# Altium footprint library ICs And Semiconductors SMD.PcbLib: 943 footprints (part 17 of 60)
Each footprint in its own frame and in the unit in brackets; x right, y up, seen from the top. Pads: shape width x height; smd on the part's side, far side on the other; paste and mask are expansions set on the pad; w line width, h text height; cw(c..) or ccw(c..) is an arc to the next point about the centre after c.
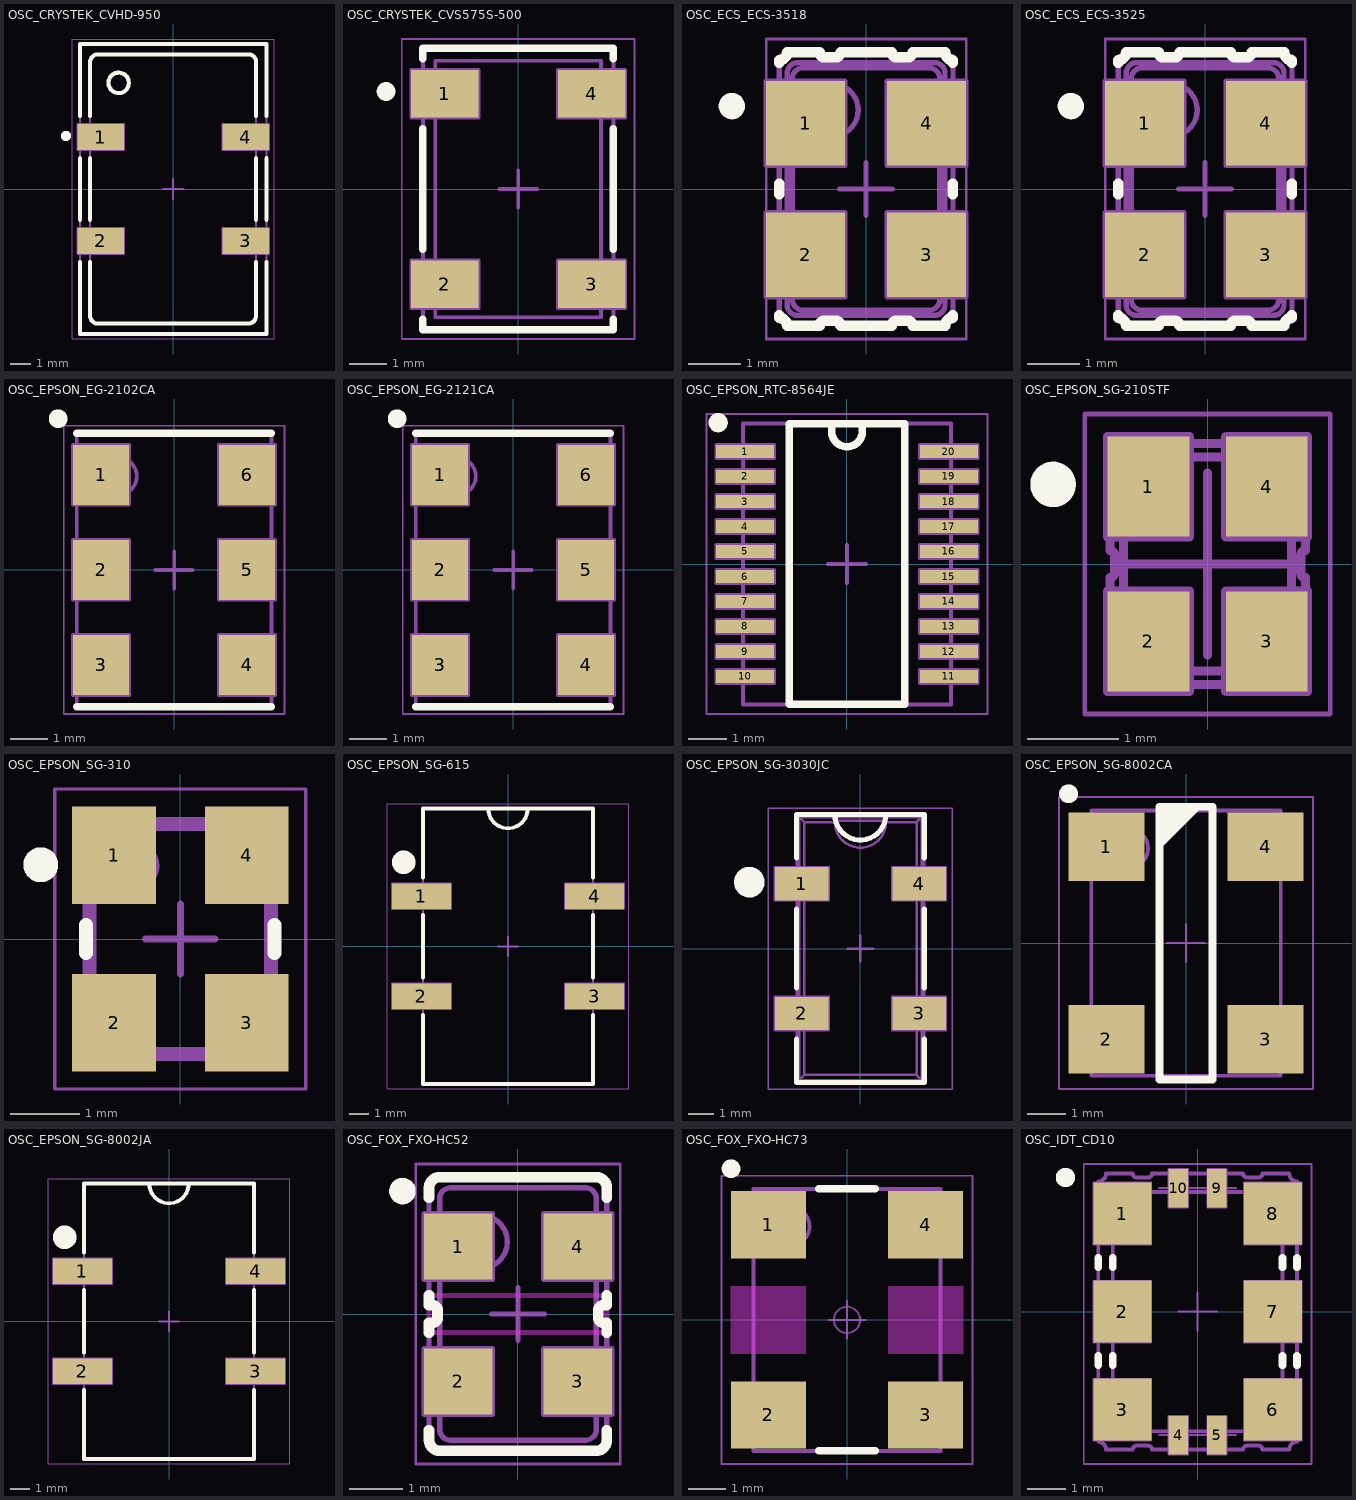
[diagram p16: the footprints below, top view; thin cyan lines are the x and y axes]

## OSC_CRYSTEK_CVHD-950 [mm] "Oscillator, 5.08mm Pitch; 4 Pin, 14.2mm L X 9.14mm W X 5.3mm H, CVHD-950 Serie"
height 5.3
pads (4):
  rect 2.28x1.27 smd: 1(-3.555,2.54) 2(-3.555,-2.54) 3(3.555,-2.54) 4(3.555,2.54)
Top Overlay:
  circle w0.2: c-2.67,5.2 r0.5
  circle w0.25: c-5.25,2.6 r0.125
  lines w0.2: -4.57,-3.575 -4.57,-7.1 4.57,-7.1 4.57,-3.575 ; -4.57,-1.505 -4.57,1.505 ; -4.57,3.575 -4.57,7.1 4.57,7.1 4.57,3.575 ; -4.07,-3.575 -4.07,-6.2 ccw(c-3.67,-6.2) -3.67,-6.6 3.67,-6.6 ccw(c3.67,-6.2) 4.07,-6.2 4.07,-3.575 ; -4.07,-1.505 -4.07,1.505 ; -4.07,3.575 -4.07,6.2 cw(c-3.67,6.2) -3.67,6.6 3.67,6.6 cw(c3.67,6.2) 4.07,6.2 4.07,3.575 ; 4.07,-1.505 4.07,1.505 ; 4.57,-1.505 4.57,1.505
Mechanical 8:
  lines w0.1: -4.055,-2.54 -3.555,-2.54 ; -4.055,2.54 -3.555,2.54 ; -3.555,-3.04 -3.555,-2.54 ; -3.555,-2.04 -3.555,-2.54 ; -3.555,2.04 -3.555,2.54 ; -3.555,3.04 -3.555,2.54 ; -3.055,-2.54 -3.555,-2.54 ; -3.055,2.54 -3.555,2.54 ; -0.5,0 0,0 ; 0,-0.5 0,0 ; 0,0.5 0,0 ; 0.5,0 0,0 ; 3.055,-2.54 3.555,-2.54 ; 3.055,2.54 3.555,2.54 ; 3.555,-3.04 3.555,-2.54 ; 3.555,-2.04 3.555,-2.54 ; 3.555,2.04 3.555,2.54 ; 3.555,3.04 3.555,2.54 ; 4.055,-2.54 3.555,-2.54 ; 4.055,2.54 3.555,2.54 ; -4.695,-3.175 -4.695,-1.905 -2.415,-1.905 -2.415,-3.175 -4.695,-3.175 ; -4.695,1.905 -4.695,3.175 -2.415,3.175 -2.415,1.905 -4.695,1.905 ; 2.415,-3.175 2.415,-1.905 4.695,-1.905 4.695,-3.175 2.415,-3.175 ; 2.415,1.905 2.415,3.175 4.695,3.175 4.695,1.905 2.415,1.905
Mechanical 14:
  circle w0.1: c-2.67,5.2 r0.5
  lines w0.1: -4.57,-3.045 -4.07,-3.045 ; -4.57,-2.035 -4.07,-2.035 ; -4.57,2.035 -4.07,2.035 ; -4.57,3.045 -4.07,3.045 ; 4.07,-3.045 4.57,-3.045 ; 4.07,-2.035 4.57,-2.035 ; 4.07,2.035 4.57,2.035 ; 4.07,3.045 4.57,3.045 ; -4.57,-7.1 4.57,-7.1 4.57,-2.94 cw(c4.57,-2.54) 4.57,-2.14 4.57,2.14 cw(c4.57,2.54) 4.57,2.94 4.57,7.1 -4.57,7.1 -4.57,2.94 cw(c-4.57,2.54) -4.57,2.14 -4.57,-2.14 cw(c-4.57,-2.54) -4.57,-2.94 -4.57,-7.1 ; -4.07,-6.2 ccw(c-3.67,-6.2) -3.67,-6.6 3.67,-6.6 ccw(c3.67,-6.2) 4.07,-6.2 4.07,6.2 ccw(c3.67,6.2) 3.67,6.6 -3.67,6.6 ccw(c-3.67,6.2) -4.07,6.2 -4.07,-6.2
Mechanical 15:
  lines w0.05: -4.945,-7.35 -4.945,7.35 4.945,7.35 4.945,-7.35 -4.945,-7.35
3D body "OSC_CRYSTEK_CVHD-950.stp": height 5.3, standoff 0, extent -4.57,-7.1 4.57,7.1

## OSC_CRYSTEK_CVS575S-500 [mm] "VCO, 5.08mm Pitch; 4 Pin, 5.08mm L X 7.5mm W X 2.5mm H"
height 2.5
pads (4):
  rect 1.8x1.27 smd: 1(-1.955,2.54) 2(-1.955,-2.54) 3(1.955,-2.54) 4(1.955,2.54)
Top Overlay:
  circle w0.25: c-3.525,2.6 r0.125
  lines w0.2: -2.54,-3.475 -2.54,-3.75 2.54,-3.75 2.54,-3.475 ; -2.54,-1.605 -2.54,1.605 ; -2.54,3.475 -2.54,3.75 2.54,3.75 2.54,3.475 ; 2.54,-1.605 2.54,1.605
Mechanical 8:
  lines w0.1: -2.455,-2.54 -1.955,-2.54 ; -2.455,2.54 -1.955,2.54 ; -1.955,-3.04 -1.955,-2.54 ; -1.955,-2.04 -1.955,-2.54 ; -1.955,2.04 -1.955,2.54 ; -1.955,3.04 -1.955,2.54 ; -1.455,-2.54 -1.955,-2.54 ; -1.455,2.54 -1.955,2.54 ; -0.5,0 0,0 ; 0,-0.5 0,0 ; 0,0.5 0,0 ; 0.5,0 0,0 ; 1.455,-2.54 1.955,-2.54 ; 1.455,2.54 1.955,2.54 ; 1.955,-3.04 1.955,-2.54 ; 1.955,-2.04 1.955,-2.54 ; 1.955,2.04 1.955,2.54 ; 1.955,3.04 1.955,2.54 ; 2.455,-2.54 1.955,-2.54 ; 2.455,2.54 1.955,2.54 ; -2.855,-3.175 -1.055,-3.175 -1.055,-1.905 -2.855,-1.905 -2.855,-3.175 ; -2.855,1.905 -1.055,1.905 -1.055,3.175 -2.855,3.175 -2.855,1.905 ; 1.055,-3.175 2.855,-3.175 2.855,-1.905 1.055,-1.905 1.055,-3.175 ; 1.055,1.905 2.855,1.905 2.855,3.175 1.055,3.175 1.055,1.905
Mechanical 14:
  circle w0.1: c-1.555,2.55 r0.4
  lines w0.1: -2.54,-3.75 -2.54,3.75 2.54,3.75 2.54,-3.75 -2.54,-3.75 ; -2.21,-3.42 2.21,-3.42 2.21,3.42 -2.21,3.42 -2.21,-3.42
Mechanical 15:
  lines w0.05: -3.105,-4 -3.105,4 3.105,4 3.105,-4 -3.105,-4
3D body "OSC_CRYSTEK_CVS575S-500.stp": height 2.5, standoff 0, extent -2.54,-3.75 2.54,3.75

## OSC_ECS_ECS-3518 [mm] "SMD Oscillator, 4 pins, 5 x 3.2mm, 3518 Series"
height 1.3
pads (4):
  rect 1.5x1.6 smd: 1(-1.15,1.25) 2(-1.15,-1.25) 3(1.15,-1.25) 4(1.15,1.25)
Top Overlay:
  circle w0.25: c-2.55,1.575 r0.125
  lines w0.2: -1.65,-2.4 -1.65,-2.45 cw(c-1.65,-2.6) -1.5,-2.6 -0.885,-2.6 cw(c-0.785,-2.6) -0.785,-2.5 -0.585,-2.5 cw(c-0.585,-2.6) -0.485,-2.6 0.485,-2.6 cw(c0.585,-2.6) 0.585,-2.5 0.785,-2.5 cw(c0.785,-2.6) 0.885,-2.6 1.5,-2.6 cw(c1.65,-2.6) 1.65,-2.45 1.65,-2.4 ; -1.65,-0.1 -1.65,0.1 ; -1.65,2.4 -1.65,2.45 ccw(c-1.65,2.6) -1.5,2.6 -0.885,2.6 ccw(c-0.785,2.6) -0.785,2.5 -0.585,2.5 ccw(c-0.585,2.6) -0.485,2.6 0.485,2.6 ccw(c0.585,2.6) 0.585,2.5 0.785,2.5 ccw(c0.785,2.6) 0.885,2.6 1.5,2.6 ccw(c1.65,2.6) 1.65,2.45 1.65,2.4 ; 1.65,-0.1 1.65,0.1
Mechanical 8:
  lines w0.1: -1.65,-1.25 -1.15,-1.25 ; -1.65,1.25 -1.15,1.25 ; -1.15,-1.75 -1.15,-1.25 ; -1.15,-0.75 -1.15,-1.25 ; -1.15,0.75 -1.15,1.25 ; -1.15,1.75 -1.15,1.25 ; -0.65,-1.25 -1.15,-1.25 ; -0.65,1.25 -1.15,1.25 ; -0.5,0 0,0 ; 0,-0.5 0,0 ; 0,0.5 0,0 ; 0.5,0 0,0 ; 0.65,-1.25 1.15,-1.25 ; 0.65,1.25 1.15,1.25 ; 1.15,-1.75 1.15,-1.25 ; 1.15,-0.75 1.15,-1.25 ; 1.15,0.75 1.15,1.25 ; 1.15,1.75 1.15,1.25 ; 1.65,-1.25 1.15,-1.25 ; 1.65,1.25 1.15,1.25 ; -1.9,-2.05 -1.9,-0.45 -0.4,-0.45 -0.4,-2.05 -1.9,-2.05 ; -1.9,0.45 -1.9,2.05 -0.4,2.05 -0.4,0.45 -1.9,0.45 ; 0.4,-2.05 0.4,-0.45 1.9,-0.45 1.9,-2.05 0.4,-2.05 ; 0.4,0.45 0.4,2.05 1.9,2.05 1.9,0.45 0.4,0.45
Mechanical 14:
  circle w0.1: c-0.65,1.5 r0.5
  lines w0.1: -1.65,-2.45 cw(c-1.65,-2.6) -1.5,-2.6 -0.885,-2.6 cw(c-0.785,-2.6) -0.785,-2.5 -0.585,-2.5 cw(c-0.585,-2.6) -0.485,-2.6 0.485,-2.6 cw(c0.585,-2.6) 0.585,-2.5 0.785,-2.5 cw(c0.785,-2.6) 0.885,-2.6 1.5,-2.6 cw(c1.65,-2.6) 1.65,-2.45 1.65,-1.97 1.55,-1.87 1.55,-0.67 1.65,-0.57 1.65,0.57 1.55,0.67 1.55,1.87 1.65,1.97 1.65,2.45 cw(c1.65,2.6) 1.5,2.6 0.885,2.6 cw(c0.785,2.6) 0.785,2.5 0.585,2.5 cw(c0.585,2.6) 0.485,2.6 -0.485,2.6 cw(c-0.585,2.6) -0.585,2.5 -0.785,2.5 cw(c-0.785,2.6) -0.885,2.6 -1.5,2.6 cw(c-1.65,2.6) -1.65,2.45 -1.65,1.97 -1.55,1.87 -1.55,0.67 -1.65,0.57 -1.65,-0.57 -1.55,-0.67 -1.55,-1.87 -1.65,-1.97 -1.65,-2.45 ; -1.5,-2.2 ccw(c-1.3,-2.2) -1.3,-2.4 1.3,-2.4 ccw(c1.3,-2.2) 1.5,-2.2 1.5,2.2 ccw(c1.3,2.2) 1.3,2.4 -1.3,2.4 ccw(c-1.3,2.2) -1.5,2.2 -1.5,-2.2 ; -1.4,-2.1 ccw(c-1.197,-2.099) -1.2,-2.302 1.2,-2.3 ccw(c1.2,-2.1) 1.4,-2.1 1.4,2.1 ccw(c1.2,2.1) 1.2,2.3 -1.2,2.3 ccw(c-1.2,2.1) -1.4,2.1 -1.4,-2.1
Mechanical 15:
  lines w0.05: -1.9,-2.85 1.9,-2.85 1.9,2.85 -1.9,2.85 -1.9,-2.85
3D body "OSC_ECS_3518.stp": height 1.3, standoff 0, extent -1.65,-2.6 1.65,2.6

## OSC_ECS_ECS-3525 [mm] "SMD Oscillator, 4 pins, 5 x 3.2mm, 3525 Series"
height 1.3
pads (4):
  rect 1.5x1.6 smd: 1(-1.15,1.25) 2(-1.15,-1.25) 3(1.15,-1.25) 4(1.15,1.25)
Top Overlay:
  circle w0.25: c-2.55,1.575 r0.125
  lines w0.2: -1.65,-2.4 -1.65,-2.45 cw(c-1.65,-2.6) -1.5,-2.6 -0.885,-2.6 cw(c-0.785,-2.6) -0.785,-2.5 -0.585,-2.5 cw(c-0.585,-2.6) -0.485,-2.6 0.485,-2.6 cw(c0.585,-2.6) 0.585,-2.5 0.785,-2.5 cw(c0.785,-2.6) 0.885,-2.6 1.5,-2.6 cw(c1.65,-2.6) 1.65,-2.45 1.65,-2.4 ; -1.65,-0.1 -1.65,0.1 ; -1.65,2.4 -1.65,2.45 ccw(c-1.65,2.6) -1.5,2.6 -0.885,2.6 ccw(c-0.785,2.6) -0.785,2.5 -0.585,2.5 ccw(c-0.585,2.6) -0.485,2.6 0.485,2.6 ccw(c0.585,2.6) 0.585,2.5 0.785,2.5 ccw(c0.785,2.6) 0.885,2.6 1.5,2.6 ccw(c1.65,2.6) 1.65,2.45 1.65,2.4 ; 1.65,-0.1 1.65,0.1
Mechanical 8:
  lines w0.1: -1.65,-1.25 -1.15,-1.25 ; -1.65,1.25 -1.15,1.25 ; -1.15,-1.75 -1.15,-1.25 ; -1.15,-0.75 -1.15,-1.25 ; -1.15,0.75 -1.15,1.25 ; -1.15,1.75 -1.15,1.25 ; -0.65,-1.25 -1.15,-1.25 ; -0.65,1.25 -1.15,1.25 ; -0.5,0 0,0 ; 0,-0.5 0,0 ; 0,0.5 0,0 ; 0.5,0 0,0 ; 0.65,-1.25 1.15,-1.25 ; 0.65,1.25 1.15,1.25 ; 1.15,-1.75 1.15,-1.25 ; 1.15,-0.75 1.15,-1.25 ; 1.15,0.75 1.15,1.25 ; 1.15,1.75 1.15,1.25 ; 1.65,-1.25 1.15,-1.25 ; 1.65,1.25 1.15,1.25 ; -1.9,-2.05 -0.4,-2.05 -0.4,-0.45 -1.9,-0.45 -1.9,-2.05 ; -1.9,0.45 -0.4,0.45 -0.4,2.05 -1.9,2.05 -1.9,0.45 ; 0.4,-2.05 1.9,-2.05 1.9,-0.45 0.4,-0.45 0.4,-2.05 ; 0.4,0.45 1.9,0.45 1.9,2.05 0.4,2.05 0.4,0.45
Mechanical 14:
  circle w0.1: c-0.65,1.5 r0.5
  lines w0.1: -1.65,-2.45 cw(c-1.65,-2.6) -1.5,-2.6 -0.885,-2.6 cw(c-0.785,-2.6) -0.785,-2.5 -0.585,-2.5 cw(c-0.585,-2.6) -0.485,-2.6 0.485,-2.6 cw(c0.585,-2.6) 0.585,-2.5 0.785,-2.5 cw(c0.785,-2.6) 0.885,-2.6 1.5,-2.6 cw(c1.65,-2.6) 1.65,-2.45 1.65,-1.97 1.55,-1.87 1.55,-0.67 1.65,-0.57 1.65,0.57 1.55,0.67 1.55,1.87 1.65,1.97 1.65,2.45 cw(c1.65,2.6) 1.5,2.6 0.885,2.6 cw(c0.785,2.6) 0.785,2.5 0.585,2.5 cw(c0.585,2.6) 0.485,2.6 -0.485,2.6 cw(c-0.585,2.6) -0.585,2.5 -0.785,2.5 cw(c-0.785,2.6) -0.885,2.6 -1.5,2.6 cw(c-1.65,2.6) -1.65,2.45 -1.65,1.97 -1.55,1.87 -1.55,0.67 -1.65,0.57 -1.65,-0.57 -1.55,-0.67 -1.55,-1.87 -1.65,-1.97 -1.65,-2.45 ; -1.5,-2.2 ccw(c-1.3,-2.2) -1.3,-2.4 1.3,-2.4 ccw(c1.3,-2.2) 1.5,-2.2 1.5,2.2 ccw(c1.3,2.2) 1.3,2.4 -1.3,2.4 ccw(c-1.3,2.2) -1.5,2.2 -1.5,-2.2 ; -1.4,-2.1 ccw(c-1.197,-2.099) -1.2,-2.302 1.2,-2.3 ccw(c1.2,-2.1) 1.4,-2.1 1.4,2.1 ccw(c1.2,2.1) 1.2,2.3 -1.2,2.3 ccw(c-1.2,2.1) -1.4,2.1 -1.4,-2.1
Mechanical 15:
  lines w0.05: -1.9,-2.85 -1.9,2.85 1.9,2.85 1.9,-2.85 -1.9,-2.85
3D body "OSC_ECS_3525.stp": height 1.3, standoff 0, extent -1.65,-2.6 1.65,2.6

## OSC_EPSON_EG-2102CA [mm] "SMD Oscillator, side concave, 6 pins, 5.00x7.00mm"
height 1.4
pads (6):
  rect 1.5x1.6 smd: 1(-1.95,2.54) 2(-1.95,0) 3(-1.95,-2.54) 4(1.95,-2.54) 5(1.95,0) 6(1.95,2.54)
Top Overlay:
  circle w0.25: c-3.1,4.04 r0.125
  lines w0.2: -2.6,-3.65 2.6,-3.65 ; -2.6,3.65 2.6,3.65
Mechanical 8:
  lines w0.1: -2.45,-2.54 -1.95,-2.54 ; -2.45,0 -1.95,0 ; -2.45,2.54 -1.95,2.54 ; -1.95,-3.04 -1.95,-2.54 ; -1.95,-2.04 -1.95,-2.54 ; -1.95,-0.5 -1.95,0 ; -1.95,0.5 -1.95,0 ; -1.95,2.04 -1.95,2.54 ; -1.95,3.04 -1.95,2.54 ; -1.45,-2.54 -1.95,-2.54 ; -1.45,0 -1.95,0 ; -1.45,2.54 -1.95,2.54 ; -0.5,0 0,0 ; 0,-0.5 0,0 ; 0,0.5 0,0 ; 0.5,0 0,0 ; 1.45,-2.54 1.95,-2.54 ; 1.45,0 1.95,0 ; 1.45,2.54 1.95,2.54 ; 1.95,-3.04 1.95,-2.54 ; 1.95,-2.04 1.95,-2.54 ; 1.95,-0.5 1.95,0 ; 1.95,0.5 1.95,0 ; 1.95,2.04 1.95,2.54 ; 1.95,3.04 1.95,2.54 ; 2.45,-2.54 1.95,-2.54 ; 2.45,0 1.95,0 ; 2.45,2.54 1.95,2.54 ; -2.7,-3.34 -1.2,-3.34 -1.2,-1.74 -2.7,-1.74 -2.7,-3.34 ; -2.7,-0.8 -1.2,-0.8 -1.2,0.8 -2.7,0.8 -2.7,-0.8 ; -2.7,1.74 -1.2,1.74 -1.2,3.34 -2.7,3.34 -2.7,1.74 ; 1.2,-3.34 2.7,-3.34 2.7,-1.74 1.2,-1.74 1.2,-3.34 ; 1.2,-0.8 2.7,-0.8 2.7,0.8 1.2,0.8 1.2,-0.8 ; 1.2,1.74 2.7,1.74 2.7,3.34 1.2,3.34 1.2,1.74
Mechanical 14:
  circle w0.1: c-1.5,2.5 r0.5
  lines w0.1: -2.6,-3.6 -2.6,3.6 2.6,3.6 2.6,-3.6 -2.6,-3.6
Mechanical 15:
  lines w0.05: -2.95,-3.85 2.95,-3.85 2.95,3.85 -2.95,3.85 -2.95,-3.85
3D body "OSC_EPSON_EG-2102CA.stp": height 1.4, standoff 0, extent -2.6,-3.6 2.6,3.6

## OSC_EPSON_EG-2121CA [mm] "SMD Oscillator, side concave, 6 pins, 5.00x7.00mm"
height 1.4
pads (6):
  rect 1.5x1.6 smd: 1(-1.95,2.54) 2(-1.95,0) 3(-1.95,-2.54) 4(1.95,-2.54) 5(1.95,0) 6(1.95,2.54)
Top Overlay:
  circle w0.25: c-3.1,4.04 r0.125
  lines w0.2: -2.6,-3.65 2.6,-3.65 ; -2.6,3.65 2.6,3.65
Mechanical 8:
  lines w0.1: -2.45,-2.54 -1.95,-2.54 ; -2.45,0 -1.95,0 ; -2.45,2.54 -1.95,2.54 ; -1.95,-3.04 -1.95,-2.54 ; -1.95,-2.04 -1.95,-2.54 ; -1.95,-0.5 -1.95,0 ; -1.95,0.5 -1.95,0 ; -1.95,2.04 -1.95,2.54 ; -1.95,3.04 -1.95,2.54 ; -1.45,-2.54 -1.95,-2.54 ; -1.45,0 -1.95,0 ; -1.45,2.54 -1.95,2.54 ; -0.5,0 0,0 ; 0,-0.5 0,0 ; 0,0.5 0,0 ; 0.5,0 0,0 ; 1.45,-2.54 1.95,-2.54 ; 1.45,0 1.95,0 ; 1.45,2.54 1.95,2.54 ; 1.95,-3.04 1.95,-2.54 ; 1.95,-2.04 1.95,-2.54 ; 1.95,-0.5 1.95,0 ; 1.95,0.5 1.95,0 ; 1.95,2.04 1.95,2.54 ; 1.95,3.04 1.95,2.54 ; 2.45,-2.54 1.95,-2.54 ; 2.45,0 1.95,0 ; 2.45,2.54 1.95,2.54 ; -2.7,-3.34 -1.2,-3.34 -1.2,-1.74 -2.7,-1.74 -2.7,-3.34 ; -2.7,-0.8 -1.2,-0.8 -1.2,0.8 -2.7,0.8 -2.7,-0.8 ; -2.7,1.74 -1.2,1.74 -1.2,3.34 -2.7,3.34 -2.7,1.74 ; 1.2,-3.34 2.7,-3.34 2.7,-1.74 1.2,-1.74 1.2,-3.34 ; 1.2,-0.8 2.7,-0.8 2.7,0.8 1.2,0.8 1.2,-0.8 ; 1.2,1.74 2.7,1.74 2.7,3.34 1.2,3.34 1.2,1.74
Mechanical 14:
  circle w0.1: c-1.5,2.5 r0.5
  lines w0.1: -2.6,-3.6 -2.6,3.6 2.6,3.6 2.6,-3.6 -2.6,-3.6
Mechanical 15:
  lines w0.05: -2.95,-3.85 2.95,-3.85 2.95,3.85 -2.95,3.85 -2.95,-3.85
3D body "OSC_EPSON_EG-2121CA.stp": height 1.4, standoff 0, extent -2.6,-3.6 2.6,3.6

## OSC_EPSON_RTC-8564JE [mm] "VSOJ, 0.65mm Pitch, 20 Pin, 7.00mm L X 5.4mm W X 1.5mm H Body"
height 1.5
pads (20):
  rect 1.5x0.35 smd: 1(-2.65,2.925) 2(-2.65,2.275) 3(-2.65,1.625) 4(-2.65,0.975) 5(-2.65,0.325) 6(-2.65,-0.325) 7(-2.65,-0.975) 8(-2.65,-1.625) 9(-2.65,-2.275) 10(-2.65,-2.925) 11(2.65,-2.925) 12(2.65,-2.275) 13(2.65,-1.625) 14(2.65,-0.975) 15(2.65,-0.325) 16(2.65,0.325) 17(2.65,0.975) 18(2.65,1.625) 19(2.65,2.275) 20(2.65,2.925)
Top Overlay:
  circle w0.25: c-3.35,3.675 r0.125
  lines w0.2: -0.4,3.65 -0.4,3.45 ccw(c0,3.45) 0.4,3.45 0.4,3.65 ; -1.5,-3.65 1.5,-3.65 1.5,3.65 -1.5,3.65 -1.5,-3.65
Mechanical 8:
  lines w0.1: -0.5,0 0,0 ; 0,-0.5 0,0 ; 0,0.5 0,0 ; 0.5,0 0,0 ; -3.4,-3.1 -1.9,-3.1 -1.9,-2.75 -3.4,-2.75 ; -3.4,-3.1 -3.4,-2.75 ; -3.4,-3.1 -2.65,-2.925 -3.4,-2.75 ; -3.4,-2.45 -1.9,-2.45 -1.9,-2.1 -3.4,-2.1 ; -3.4,-2.45 -3.4,-2.1 ; -3.4,-2.45 -2.65,-2.275 -3.4,-2.1 ; -3.4,-1.8 -1.9,-1.8 -1.9,-1.45 -3.4,-1.45 ; -3.4,-1.8 -3.4,-1.45 ; -3.4,-1.8 -2.65,-1.625 -3.4,-1.45 ; -3.4,-1.15 -1.9,-1.15 -1.9,-0.8 -3.4,-0.8 ; -3.4,-1.15 -3.4,-0.8 ; -3.4,-1.15 -2.65,-0.975 -3.4,-0.8 ; -3.4,-0.5 -1.9,-0.5 -1.9,-0.15 -3.4,-0.15 ; -3.4,-0.5 -3.4,-0.15 ; -3.4,-0.5 -2.65,-0.325 -3.4,-0.15 ; -3.4,0.15 -1.9,0.15 -1.9,0.5 -3.4,0.5 ; -3.4,0.15 -3.4,0.5 ; -3.4,0.15 -2.65,0.325 -3.4,0.5 ; -3.4,0.8 -1.9,0.8 -1.9,1.15 -3.4,1.15 ; -3.4,0.8 -3.4,1.15 ; -3.4,0.8 -2.65,0.975 -3.4,1.15 ; -3.4,1.45 -1.9,1.45 -1.9,1.8 -3.4,1.8 ; -3.4,1.45 -3.4,1.8 ; -3.4,1.45 -2.65,1.625 -3.4,1.8 ; -3.4,2.1 -1.9,2.1 -1.9,2.45 -3.4,2.45 ; -3.4,2.1 -3.4,2.45 ; -3.4,2.1 -2.65,2.275 -3.4,2.45 ; -3.4,2.75 -1.9,2.75 -1.9,3.1 -3.4,3.1 ; -3.4,2.75 -3.4,3.1 ; -3.4,2.75 -2.65,2.925 -3.4,3.1 ; 3.4,-3.1 1.9,-3.1 1.9,-2.75 3.4,-2.75 ; 3.4,-3.1 3.4,-2.75 ; 3.4,-3.1 2.65,-2.925 3.4,-2.75 ; 3.4,-2.45 1.9,-2.45 1.9,-2.1 3.4,-2.1 ; 3.4,-2.45 3.4,-2.1 ; 3.4,-2.45 2.65,-2.275 3.4,-2.1 ; 3.4,-1.8 1.9,-1.8 1.9,-1.45 3.4,-1.45 ; 3.4,-1.8 3.4,-1.45 ; 3.4,-1.8 2.65,-1.625 3.4,-1.45 ; 3.4,-1.15 1.9,-1.15 1.9,-0.8 3.4,-0.8 ; 3.4,-1.15 3.4,-0.8 ; 3.4,-1.15 2.65,-0.975 3.4,-0.8 ; 3.4,-0.5 1.9,-0.5 1.9,-0.15 3.4,-0.15 ; 3.4,-0.5 3.4,-0.15 ; 3.4,-0.5 2.65,-0.325 3.4,-0.15 ; 3.4,0.15 1.9,0.15 1.9,0.5 3.4,0.5 ; 3.4,0.15 3.4,0.5 ; 3.4,0.15 2.65,0.325 3.4,0.5 ; 3.4,0.8 1.9,0.8 1.9,1.15 3.4,1.15 ; 3.4,0.8 3.4,1.15 ; 3.4,0.8 2.65,0.975 3.4,1.15 ; 3.4,1.45 1.9,1.45 1.9,1.8 3.4,1.8 ; 3.4,1.45 3.4,1.8 ; 3.4,1.45 2.65,1.625 3.4,1.8 ; 3.4,2.1 1.9,2.1 1.9,2.45 3.4,2.45 ; 3.4,2.1 3.4,2.45 ; 3.4,2.1 2.65,2.275 3.4,2.45 ; 3.4,2.75 1.9,2.75 1.9,3.1 3.4,3.1 ; 3.4,2.75 3.4,3.1 ; 3.4,2.75 2.65,2.925 3.4,3.1
Mechanical 14:
  lines w0.1: -0.4,3.65 -0.4,3.45 ccw(c0,3.45) 0.4,3.45 0.4,3.65 ; -2.7,-3.65 -2.7,3.65 2.7,3.65 2.7,-3.65 -2.7,-3.65
Mechanical 15:
  lines w0.05: -3.65,-3.9 3.65,-3.9 3.65,3.9 -3.65,3.9 -3.65,-3.9
3D body "OSC_EPSON_RTC-8564JE.stp": height 1.5, standoff 0, extent -3,-3.5 3,3.5

## OSC_EPSON_SG-210STF [mm] "Oscillator, Corner Concave; 4 pin, 2.50mm L X 2.00mm W X 0.90mm H, EPSON SG-210STF Series"
height 0.9
pads (4):
  rect 0.9x1.1 smd: 1(-0.65,0.85) 2(-0.65,-0.85) 3(0.65,-0.85) 4(0.65,0.85)
Top Overlay:
  circle w0.25: c-1.7,0.875 r0.125
Mechanical 8:
  lines w0.1: -1,0 0,0 ; 0,-1 0,0 ; 0,1 0,0 ; 1,0 0,0 ; -1.1,-1.4 -0.65,-0.85 -0.2,-1.4 ; -1.1,-1.4 -0.2,-1.4 ; -1.1,-1.4 -1.1,-0.3 -0.2,-0.3 -0.2,-1.4 ; -1.1,1.4 -0.65,0.85 -0.2,1.4 ; -1.1,1.4 -0.2,1.4 ; -1.1,1.4 -1.1,0.3 -0.2,0.3 -0.2,1.4 ; 0.2,-1.4 0.65,-0.85 1.1,-1.4 ; 0.2,-1.4 1.1,-1.4 ; 0.2,-1.4 0.2,-0.3 1.1,-0.3 1.1,-1.4 ; 0.2,1.4 0.65,0.85 1.1,1.4 ; 0.2,1.4 1.1,1.4 ; 0.2,1.4 0.2,0.3 1.1,0.3 1.1,1.4
Mechanical 14:
  circle w0.1: c-0.575,0.825 r0.15
  lines w0.1: -1.075,-1.225 cw(c-1.075,-1.325) -0.975,-1.325 0.975,-1.325 cw(c1.075,-1.325) 1.075,-1.225 1.075,-0.15 cw(c1.075,-0.1) 1.025,-0.1 1.025,0.1 cw(c1.075,0.1) 1.075,0.15 1.075,1.225 cw(c1.075,1.325) 0.975,1.325 -0.975,1.325 cw(c-1.075,1.325) -1.075,1.225 -1.075,0.15 cw(c-1.075,0.1) -1.025,0.1 -1.025,-0.1 cw(c-1.075,-0.1) -1.075,-0.15 -1.075,-1.225 ; -0.925,-0.925 ccw(c-0.675,-0.925) -0.675,-1.175 0.675,-1.175 ccw(c0.675,-0.925) 0.925,-0.925 0.925,0.925 ccw(c0.675,0.925) 0.675,1.175 -0.675,1.175 ccw(c-0.675,0.925) -0.925,0.925 -0.925,-0.925
Mechanical 15:
  lines w0.05: -1.35,-1.65 -1.35,1.65 1.35,1.65 1.35,-1.65 -1.35,-1.65
3D body "OSC_EPSON_SG-210STF.stp": height 0.9, standoff 0, extent -1.075,-1.325 1.075,1.325

## OSC_EPSON_SG-310 [mm] "Oscillator, Corner Concave; 4 pin, 3.2mm L X 2.5mm W X 1.2mm H"
height 1.2
pads (4):
  rect 1.2x1.4 smd: 1(-0.95,1.2) 2(-0.95,-1.2) 3(0.95,-1.2) 4(0.95,1.2)
Top Overlay:
  circle w0.25: c-2,1.063 r0.125
  lines w0.2: -1.35,-0.2 -1.35,0.2 ; 1.35,-0.2 1.35,0.2
Mechanical 8:
  lines w0.1: -1.45,-1.2 -0.95,-1.2 ; -1.45,1.2 -0.95,1.2 ; -0.95,-1.7 -0.95,-1.2 ; -0.95,-0.7 -0.95,-1.2 ; -0.95,0.7 -0.95,1.2 ; -0.95,1.7 -0.95,1.2 ; -0.5,0 0,0 ; -0.45,-1.2 -0.95,-1.2 ; -0.45,1.2 -0.95,1.2 ; 0,-0.5 0,0 ; 0,0.5 0,0 ; 0.45,-1.2 0.95,-1.2 ; 0.45,1.2 0.95,1.2 ; 0.5,0 0,0 ; 0.95,-1.7 0.95,-1.2 ; 0.95,-0.7 0.95,-1.2 ; 0.95,0.7 0.95,1.2 ; 0.95,1.7 0.95,1.2 ; 1.45,-1.2 0.95,-1.2 ; 1.45,1.2 0.95,1.2
Mechanical 14:
  circle w0.1: c-0.65,1.05 r0.3
  lines w0.1: -1.35,-1.5 ccw(c-1.15,-1.5) -1.15,-1.7 1.15,-1.7 ccw(c1.15,-1.5) 1.35,-1.5 1.35,1.5 ccw(c1.15,1.5) 1.15,1.7 -1.15,1.7 ccw(c-1.15,1.5) -1.35,1.5 -1.35,-1.5 ; -1.25,-1.4 ccw(c-1.05,-1.4) -1.05,-1.6 1.05,-1.6 ccw(c1.05,-1.4) 1.25,-1.4 1.25,1.4 ccw(c1.05,1.4) 1.05,1.6 -1.05,1.6 ccw(c-1.05,1.4) -1.25,1.4 -1.25,-1.4
Mechanical 15:
  lines w0.05: -1.8,-2.15 -1.8,2.15 1.8,2.15 1.8,-2.15 -1.8,-2.15
3D body "OSC_EPSON_SG-310.stp": height 1.2, standoff 0, extent -1.25,-1.65 1.25,1.65

## OSC_EPSON_SG-615 [mm] "Oscillator, J-lead; 5.08mm pitch; 4 pin, 14mm L X 8.65mm W X 4.70mm H"
height 4.7
pads (4):
  rect 3x1.3 smd: 1(-4.4,2.54) 2(-4.4,-2.54) 3(4.4,-2.54) 4(4.4,2.54)
Top Overlay:
  circle w0.6: c-5.3,4.275 r0.3
  lines w0.2: -4.325,-3.49 -4.325,-7 4.325,-7 4.325,-3.49 ; -4.325,-1.59 -4.325,1.59 ; -4.325,3.49 -4.325,7 4.325,7 4.325,3.49 ; -1,7 ccw(c0,7) 1,7 ; 4.325,-1.59 4.325,1.59
Mechanical 8:
  lines w0.1: -4.9,-2.54 -4.4,-2.54 ; -4.9,2.54 -4.4,2.54 ; -4.4,-3.04 -4.4,-2.54 ; -4.4,-2.04 -4.4,-2.54 ; -4.4,2.04 -4.4,2.54 ; -4.4,3.04 -4.4,2.54 ; -3.9,-2.54 -4.4,-2.54 ; -3.9,2.54 -4.4,2.54 ; -0.5,0 0,0 ; 0,-0.5 0,0 ; 0,0.5 0,0 ; 0.5,0 0,0 ; 3.9,-2.54 4.4,-2.54 ; 3.9,2.54 4.4,2.54 ; 4.4,-3.04 4.4,-2.54 ; 4.4,-2.04 4.4,-2.54 ; 4.4,2.04 4.4,2.54 ; 4.4,3.04 4.4,2.54 ; 4.9,-2.54 4.4,-2.54 ; 4.9,2.54 4.4,2.54 ; -5.9,-3.19 -2.9,-3.19 -2.9,-1.89 -5.9,-1.89 -5.9,-3.19 ; -5.9,1.89 -2.9,1.89 -2.9,3.19 -5.9,3.19 -5.9,1.89 ; 2.9,-3.19 5.9,-3.19 5.9,-1.89 2.9,-1.89 2.9,-3.19 ; 2.9,1.89 5.9,1.89 5.9,3.19 2.9,3.19 2.9,1.89
Mechanical 14:
  lines w0.1: -1,7 ccw(c0,7) 1,7 ; -4.325,-7 -4.325,7 4.325,7 4.325,-7 -4.325,-7
Mechanical 15:
  lines w0.05: -6.15,-7.25 6.15,-7.25 6.15,7.25 -6.15,7.25 -6.15,-7.25
3D body "OSC_EPSON_SG-615.stp": height 4.7, standoff 0, extent -4.91,-7 4.91,7

## OSC_EPSON_SG-3030JC [mm] "Oscillator, J-lead; 5.08mm pitch; 4 pin, 10.5mm L X 5.0mm W X 2.7mm H, EPSON SG-3030JC Series"
height 2.7
pads (4):
  rect 2.1x1.3 smd: 1(-2.3,2.54) 2(-2.3,-2.54) 3(2.3,-2.54) 4(2.3,2.54)
Top Overlay:
  circle w0.6: c-4.35,2.6 r0.3
  lines w0.2: -2.5,-3.54 -2.5,-5.25 2.5,-5.25 2.5,-3.54 ; -2.5,-1.54 -2.5,1.54 ; -2.5,3.54 -2.5,5.25 2.5,5.25 2.5,3.54 ; -1,5.25 ccw(c0,5.25) 1,5.25 ; 2.5,-1.54 2.5,1.54
Mechanical 8:
  lines w0.1: -2.8,-2.54 -2.3,-2.54 ; -2.8,2.54 -2.3,2.54 ; -2.3,-3.04 -2.3,-2.54 ; -2.3,-2.04 -2.3,-2.54 ; -2.3,2.04 -2.3,2.54 ; -2.3,3.04 -2.3,2.54 ; -1.8,-2.54 -2.3,-2.54 ; -1.8,2.54 -2.3,2.54 ; -0.5,0 0,0 ; 0,-0.5 0,0 ; 0,0.5 0,0 ; 0.5,0 0,0 ; 1.8,-2.54 2.3,-2.54 ; 1.8,2.54 2.3,2.54 ; 2.3,-3.04 2.3,-2.54 ; 2.3,-2.04 2.3,-2.54 ; 2.3,2.04 2.3,2.54 ; 2.3,3.04 2.3,2.54 ; 2.8,-2.54 2.3,-2.54 ; 2.8,2.54 2.3,2.54 ; -3.35,-3.19 -1.25,-3.19 -1.25,-1.89 -3.35,-1.89 -3.35,-3.19 ; -3.35,1.89 -1.25,1.89 -1.25,3.19 -3.35,3.19 -3.35,1.89 ; 1.25,-3.19 3.35,-3.19 3.35,-1.89 1.25,-1.89 1.25,-3.19 ; 1.25,1.89 3.35,1.89 3.35,3.19 1.25,3.19 1.25,1.89
Mechanical 14:
  lines w0.1: -2.5,-2.795 -2.5,-5.25 2.5,-5.25 2.5,-2.795 ; -2.5,-2.285 -2.5,2.285 ; -2.5,2.795 -2.5,5.25 2.5,5.25 2.5,2.795 ; -2.4,-2.795 -2.9,-2.795 -2.9,-2.285 -2.4,-2.285 ; -2.4,2.285 -2.9,2.285 -2.9,2.795 -2.4,2.795 ; -1,4.95 -2.2,4.95 ; 1,4.95 2.2,4.95 ; 2.4,-2.795 2.9,-2.795 2.9,-2.285 2.4,-2.285 ; 2.4,2.285 2.9,2.285 2.9,2.795 2.4,2.795 ; 2.5,-2.285 2.5,2.285 ; -2.4,-5.15 -2.2,-4.95 ; -2.4,-5.15 -2.4,5.15 ; -2.4,-5.15 2.4,-5.15 ; -2.4,5.15 -2.2,4.95 ; -2.4,5.15 2.4,5.15 ; -2.2,-4.95 -2.2,4.95 ; -2.2,-4.95 2.2,-4.95 ; 2.2,-4.95 2.4,-5.15 ; 2.2,-4.95 2.2,4.95 ; 2.2,4.95 2.4,5.15 ; 2.4,-5.15 2.4,5.15 ; -0.998,5.006 ccw(c0,4.95) 0.998,5.006 -0.998,5.006
Mechanical 15:
  lines w0.05: -3.6,-5.5 3.6,-5.5 3.6,5.5 -3.6,5.5 -3.6,-5.5
3D body "OSC_EPSON_SG-3030JC.stp": height 2.7, standoff 0, extent -2.9,-5.25 2.9,5.25

## OSC_EPSON_SG-8002CA [mm] "SMD Oscillator, Side Convave, 4 pins, 5.00x7.00mm SG-8002CA Serie"
height 1.5
pads (4):
  rect 2x1.8 smd: 1(-2.1,2.54) 2(-2.1,-2.54) 3(2.1,-2.54) 4(2.1,2.54)
Top Overlay:
  circle w0.25: c-3.1,3.94 r0.125
  lines w0.2: -0.7,2.6 0.3,3.6 ; -0.7,2.8 0.1,3.6 ; -0.7,3 -0.1,3.6 ; -0.7,3.2 -0.3,3.6 ; -0.7,3.4 -0.5,3.6 ; -0.7,-3.6 0.7,-3.6 0.7,3.6 -0.7,3.6 -0.7,-3.6
Mechanical 14:
  circle w0.1: c-1.5,2.5 r0.5
  lines w0.1: -2.5,-3.5 -2.5,3.5 2.5,3.5 2.5,-3.5 -2.5,-3.5
Mechanical 15:
  lines w0.05: -0.5,0 0.5,0 ; 0,-0.5 0,0.5 ; -3.35,-3.85 -3.35,3.85 3.35,3.85 3.35,-3.85 -3.35,-3.85
3D body "OSC_EPSON_SG-8002CA.stp": height 1.5, standoff 0, extent -2.6,-3.6 2.6,3.6

## OSC_EPSON_SG-8002JA [mm] "Oscillator, J-lead; 5.08mm pitch; 4 pin, 14mm L X 8.65mm W X 4.70mm H, EPSON SG-8002JA Series"
height 4.7
pads (4):
  rect 3x1.3 smd: 1(-4.4,2.54) 2(-4.4,-2.54) 3(4.4,-2.54) 4(4.4,2.54)
Top Overlay:
  circle w0.6: c-5.3,4.275 r0.3
  lines w0.2: -4.325,-3.49 -4.325,-7 4.325,-7 4.325,-3.49 ; -4.325,-1.59 -4.325,1.59 ; -4.325,3.49 -4.325,7 4.325,7 4.325,3.49 ; -1,7 ccw(c0,7) 1,7 ; 4.325,-1.59 4.325,1.59
Mechanical 8:
  lines w0.1: -4.9,-2.54 -4.4,-2.54 ; -4.9,2.54 -4.4,2.54 ; -4.4,-3.04 -4.4,-2.54 ; -4.4,-2.04 -4.4,-2.54 ; -4.4,2.04 -4.4,2.54 ; -4.4,3.04 -4.4,2.54 ; -3.9,-2.54 -4.4,-2.54 ; -3.9,2.54 -4.4,2.54 ; -0.5,0 0,0 ; 0,-0.5 0,0 ; 0,0.5 0,0 ; 0.5,0 0,0 ; 3.9,-2.54 4.4,-2.54 ; 3.9,2.54 4.4,2.54 ; 4.4,-3.04 4.4,-2.54 ; 4.4,-2.04 4.4,-2.54 ; 4.4,2.04 4.4,2.54 ; 4.4,3.04 4.4,2.54 ; 4.9,-2.54 4.4,-2.54 ; 4.9,2.54 4.4,2.54 ; -5.9,-3.19 -2.9,-3.19 -2.9,-1.89 -5.9,-1.89 -5.9,-3.19 ; -5.9,1.89 -2.9,1.89 -2.9,3.19 -5.9,3.19 -5.9,1.89 ; 2.9,-3.19 5.9,-3.19 5.9,-1.89 2.9,-1.89 2.9,-3.19 ; 2.9,1.89 5.9,1.89 5.9,3.19 2.9,3.19 2.9,1.89
Mechanical 14:
  lines w0.1: -1,7 ccw(c0,7) 1,7 ; -4.325,-7 -4.325,7 4.325,7 4.325,-7 -4.325,-7
Mechanical 15:
  lines w0.05: -6.15,-7.25 6.15,-7.25 6.15,7.25 -6.15,7.25 -6.15,-7.25
3D body "OSC_EPSON_SG-8002JA.stp": height 4.7, standoff 0, extent -4.91,-7 4.91,7

## OSC_FOX_FXO-HC52 [mm] "SMD Oscillator, Side Convave, 4 pins, 5x3.2mm FXO-HC52 Series"
height 1.4
pads (4):
  rect 1.29x1.24 smd: 1(-1.125,1.27) 2(-1.125,-1.27) 3(1.125,-1.27) 4(1.125,1.27)
Top Layer keep-out:
  lines w0.1: -1.675,-0.35 -1.675,0.35 1.675,0.35 1.675,-0.35 -1.675,-0.35
Top Overlay:
  circle w0.25: c-2.175,2.315 r0.125
  lines w0.2: -1.675,-2.19 -1.675,-2.375 ccw(c-1.475,-2.375) -1.475,-2.575 1.475,-2.575 ccw(c1.475,-2.375) 1.675,-2.375 1.675,-2.19 ; -1.675,-0.35 -1.675,-0.165 -1.615,-0.165 ccw(c-1.615,-0.06) -1.515,-0.092 -1.515,0.092 ccw(c-1.615,0.06) -1.615,0.165 -1.675,0.165 -1.675,0.35 ; -1.675,2.19 -1.675,2.375 cw(c-1.475,2.375) -1.475,2.575 1.475,2.575 cw(c1.475,2.375) 1.675,2.375 1.675,2.19 ; 1.675,-0.35 1.675,-0.165 1.615,-0.165 cw(c1.615,-0.06) 1.515,-0.092 1.515,0.092 cw(c1.615,0.06) 1.615,0.165 1.675,0.165 1.675,0.35
Mechanical 8:
  lines w0.1: -1.625,-1.27 -1.125,-1.27 ; -1.625,1.27 -1.125,1.27 ; -1.125,-1.77 -1.125,-1.27 ; -1.125,-0.77 -1.125,-1.27 ; -1.125,0.77 -1.125,1.27 ; -1.125,1.77 -1.125,1.27 ; -0.625,-1.27 -1.125,-1.27 ; -0.625,1.27 -1.125,1.27 ; -0.5,0 0,0 ; 0,-0.5 0,0 ; 0,0.5 0,0 ; 0.5,0 0,0 ; 0.625,-1.27 1.125,-1.27 ; 0.625,1.27 1.125,1.27 ; 1.125,-1.77 1.125,-1.27 ; 1.125,-0.77 1.125,-1.27 ; 1.125,0.77 1.125,1.27 ; 1.125,1.77 1.125,1.27 ; 1.625,-1.27 1.125,-1.27 ; 1.625,1.27 1.125,1.27 ; -1.77,-1.89 -0.48,-1.89 -0.48,-0.65 -1.77,-0.65 -1.77,-1.89 ; -1.77,0.65 -0.48,0.65 -0.48,1.89 -1.77,1.89 -1.77,0.65 ; 0.48,-1.89 1.77,-1.89 1.77,-0.65 0.48,-0.65 0.48,-1.89 ; 0.48,0.65 1.77,0.65 1.77,1.89 0.48,1.89 0.48,0.65
Mechanical 14:
  circle w0.1: c-0.7,1.36 r0.5
  lines w0.1: -1.675,-2.375 ccw(c-1.475,-2.375) -1.475,-2.575 1.475,-2.575 ccw(c1.475,-2.375) 1.675,-2.375 1.675,-1.435 1.615,-1.435 cw(c1.615,-1.33) 1.515,-1.362 1.515,-1.178 cw(c1.615,-1.21) 1.615,-1.105 1.675,-1.105 1.675,-0.165 1.615,-0.165 cw(c1.615,-0.06) 1.515,-0.092 1.515,0.092 cw(c1.615,0.06) 1.615,0.165 1.675,0.165 1.675,1.105 1.615,1.105 cw(c1.615,1.21) 1.515,1.178 1.515,1.362 cw(c1.615,1.33) 1.615,1.435 1.675,1.435 1.675,2.375 ccw(c1.475,2.375) 1.475,2.575 -1.475,2.575 ccw(c-1.475,2.375) -1.675,2.375 -1.675,1.435 -1.615,1.435 cw(c-1.615,1.33) -1.515,1.362 -1.515,1.178 cw(c-1.615,1.21) -1.615,1.105 -1.675,1.105 -1.675,0.165 -1.615,0.165 cw(c-1.615,0.06) -1.515,0.092 -1.515,-0.092 cw(c-1.615,-0.06) -1.615,-0.165 -1.675,-0.165 -1.675,-1.105 -1.615,-1.105 cw(c-1.615,-1.21) -1.515,-1.178 -1.515,-1.362 cw(c-1.615,-1.33) -1.615,-1.435 -1.675,-1.435 -1.675,-2.375 ; -1.475,-2.175 ccw(c-1.275,-2.175) -1.275,-2.375 1.275,-2.375 ccw(c1.275,-2.175) 1.475,-2.175 1.475,2.175 ccw(c1.275,2.175) 1.275,2.375 -1.275,2.375 ccw(c-1.275,2.175) -1.475,2.175 -1.475,-2.175
Mechanical 15:
  lines w0.05: -1.925,-2.825 -1.925,2.825 1.925,2.825 1.925,-2.825 -1.925,-2.825
3D body "OSC_FOX_FXO-HC52.stp": height 1.4, standoff 0, extent -1.675,-2.575 1.675,2.575

## OSC_FOX_FXO-HC73 [mm] "SMD Oscillator, Side Convave, 6 Pins, 5.00x7.00mm FXO-HC73 Serie"
height 1.4
pads (4):
  rect 2x1.8 smd: 1(-2.1,2.54) 2(-2.1,-2.54) 3(2.1,-2.54) 4(2.1,2.54)
Top Layer keep-out:
  region: 1.1,0.9 3.1,0.9 3.1,-0.9 1.1,-0.9
  region: -3.1,0.9 -1.1,0.9 -1.1,-0.9 -3.1,-0.9
Top Overlay:
  circle w0.25: c-3.1,4.04 r0.125
  lines w0.2: -0.75,-3.5 0.75,-3.5 ; -0.75,3.5 0.75,3.5
Mechanical 14:
  circle w0.1: c-1.5,2.5 r0.5
  lines w0.1: -2.5,-3.5 -2.5,3.5 2.5,3.5 2.5,-3.5 -2.5,-3.5
Mechanical 15:
  circle w0.05: c0,0 r0.35
  lines w0.05: -0.5,0 0.5,0 ; 0,-0.5 0,0.5 ; -3.35,-3.85 -3.35,3.85 3.35,3.85 3.35,-3.85 -3.35,-3.85
3D body "OSC_FOX_FXO-HC73.stp": height 1.4, standoff 0, extent -2.6,-3.6 2.6,3.6

## OSC_IDT_CD10 [mm] "10 Pins, 5 x 7 x 1.85mm CD10 Package"
height 1.85
pads (10):
  rect 1.5x1.6 smd: 1(-1.95,2.54) 2(-1.95,0) 3(-1.95,-2.54) 6(1.95,-2.54) 7(1.95,0) 8(1.95,2.54)
  rect 0.5x1 smd: 4(-0.5,-3.2) 5(0.5,-3.2) 9(0.5,3.2) 10(-0.5,3.2)
Top Overlay:
  circle w0.25: c-3.425,3.475 r0.125
  lines w0.2: -2.575,-1.39 -2.575,-1.15 ; -2.575,1.15 -2.575,1.39 ; -2.2,-1.39 -2.2,-1.15 ; -2.2,1.15 -2.2,1.39 ; 2.2,-1.39 2.2,-1.15 ; 2.2,1.15 2.2,1.39 ; 2.575,-1.39 2.575,-1.15 ; 2.575,1.15 2.575,1.39
Mechanical 8:
  lines w0.05: -2.45,-2.54 -1.95,-2.54 ; -2.45,0 -1.95,0 ; -2.45,2.54 -1.95,2.54 ; -1.95,-3.04 -1.95,-2.54 ; -1.95,-2.04 -1.95,-2.54 ; -1.95,-0.5 -1.95,0 ; -1.95,0.5 -1.95,0 ; -1.95,2.04 -1.95,2.54 ; -1.95,3.04 -1.95,2.54 ; -1.45,-2.54 -1.95,-2.54 ; -1.45,0 -1.95,0 ; -1.45,2.54 -1.95,2.54 ; -1,-3.2 -0.5,-3.2 ; -1,3.2 -0.5,3.2 ; -0.5,-3.7 -0.5,-3.2 ; -0.5,-2.7 -0.5,-3.2 ; -0.5,0 0,0 ; -0.5,2.7 -0.5,3.2 ; -0.5,3.7 -0.5,3.2 ; 0,-0.5 0,0 ; 0,0.5 0,0 ; 0.5,-3.7 0.5,-3.2 ; 0.5,-2.7 0.5,-3.2 ; 0.5,0 0,0 ; 0.5,2.7 0.5,3.2 ; 0.5,3.7 0.5,3.2 ; 1,-3.2 0.5,-3.2 ; 1,3.2 0.5,3.2 ; 1.45,-2.54 1.95,-2.54 ; 1.45,0 1.95,0 ; 1.45,2.54 1.95,2.54 ; 1.95,-3.04 1.95,-2.54 ; 1.95,-2.04 1.95,-2.54 ; 1.95,-0.5 1.95,0 ; 1.95,0.5 1.95,0 ; 1.95,2.04 1.95,2.54 ; 1.95,3.04 1.95,2.54 ; 2.45,-2.54 1.95,-2.54 ; 2.45,0 1.95,0 ; 2.45,2.54 1.95,2.54 ; -0.5,-3.2 0,-3.2 0.5,-3.2 ; -0.5,3.2 0,3.2 0.5,3.2 ; 0.25,3.7 0.75,3.7 ; 0.25,3.7 0.25,2.7 0.75,2.7 0.75,3.7 ; 0.25,3.7 0.75,3.7 ; -2.7,-3.34 -1.2,-3.34 -1.2,-1.74 -2.7,-1.74 -2.7,-3.34 ; -2.7,-0.8 -1.2,-0.8 -1.2,0.8 -2.7,0.8 -2.7,-0.8 ; -2.7,1.74 -1.2,1.74 -1.2,3.34 -2.7,3.34 -2.7,1.74 ; -0.75,-3.7 -0.75,-2.7 -0.25,-2.7 -0.25,-3.7 -0.75,-3.7 ; -0.75,2.7 -0.75,3.7 -0.25,3.7 -0.25,2.7 -0.75,2.7 ; 0.25,-3.7 0.25,-2.7 0.75,-2.7 0.75,-3.7 0.25,-3.7 ; 1.2,-3.34 2.7,-3.34 2.7,-1.74 1.2,-1.74 1.2,-3.34 ; 1.2,-0.8 2.7,-0.8 2.7,0.8 1.2,0.8 1.2,-0.8 ; 1.2,1.74 2.7,1.74 2.7,3.34 1.2,3.34 1.2,1.74
Mechanical 14:
  lines w0.1: -2.575,-3.375 cw(c-2.575,-3.575) -2.375,-3.575 -1.68,-3.575 cw(c-1.58,-3.575) -1.58,-3.475 -1.28,-3.475 cw(c-1.28,-3.575) -1.18,-3.575 -0.63,-3.575 cw(c-0.5,-3.575) -0.37,-3.575 0.37,-3.575 cw(c0.5,-3.575) 0.63,-3.575 1.18,-3.575 cw(c1.28,-3.575) 1.28,-3.475 1.58,-3.475 cw(c1.58,-3.575) 1.68,-3.575 2.375,-3.575 cw(c2.575,-3.575) 2.575,-3.375 2.575,-2.84 cw(c2.575,-2.74) 2.475,-2.74 2.475,-2.34 cw(c2.575,-2.34) 2.575,-2.24 2.575,-0.3 cw(c2.575,-0.2) 2.475,-0.2 2.475,0.2 cw(c2.575,0.2) 2.575,0.3 2.575,2.24 cw(c2.575,2.34) 2.475,2.34 2.475,2.74 cw(c2.575,2.74) 2.575,2.84 2.575,3.375 cw(c2.575,3.575) 2.375,3.575 1.68,3.575 cw(c1.58,3.575) 1.58,3.475 1.28,3.475 cw(c1.28,3.575) 1.18,3.575 0.63,3.575 cw(c0.5,3.575) 0.37,3.575 -0.37,3.575 cw(c-0.5,3.575) -0.63,3.575 -1.18,3.575 cw(c-1.28,3.575) -1.28,3.475 -1.58,3.475 cw(c-1.58,3.575) -1.68,3.575 -2.375,3.575 cw(c-2.575,3.575) -2.575,3.375 -2.575,2.84 cw(c-2.575,2.74) -2.475,2.74 -2.475,2.34 cw(c-2.575,2.34) -2.575,2.24 -2.575,0.3 cw(c-2.575,0.2) -2.475,0.2 -2.475,-0.2 cw(c-2.575,-0.2) -2.575,-0.3 -2.575,-2.24 cw(c-2.575,-2.34) -2.475,-2.34 -2.475,-2.74 cw(c-2.575,-2.74) -2.575,-2.84 -2.575,-3.375 ; -2.2,-2.85 ccw(c-1.95,-2.85) -1.95,-3.1 1.95,-3.1 ccw(c1.95,-2.85) 2.2,-2.85 2.2,2.85 ccw(c1.95,2.85) 1.95,3.1 -1.95,3.1 ccw(c-1.95,2.85) -2.2,2.85 -2.2,-2.85
Mechanical 15:
  lines w0.05: -2.95,-3.95 2.95,-3.95 2.95,3.825 -2.95,3.825 -2.95,-3.95
3D body "XTAL_IDT_CD10.stp": height 1.85, standoff 0, extent -2.575,-3.575 2.575,3.575